# Altium integrated library Connector-SIL-THP.IntLib: 464 symbols (part 1 of 2) (continued)
## DG333J-3.5-03P-13-00A(H) (continued)
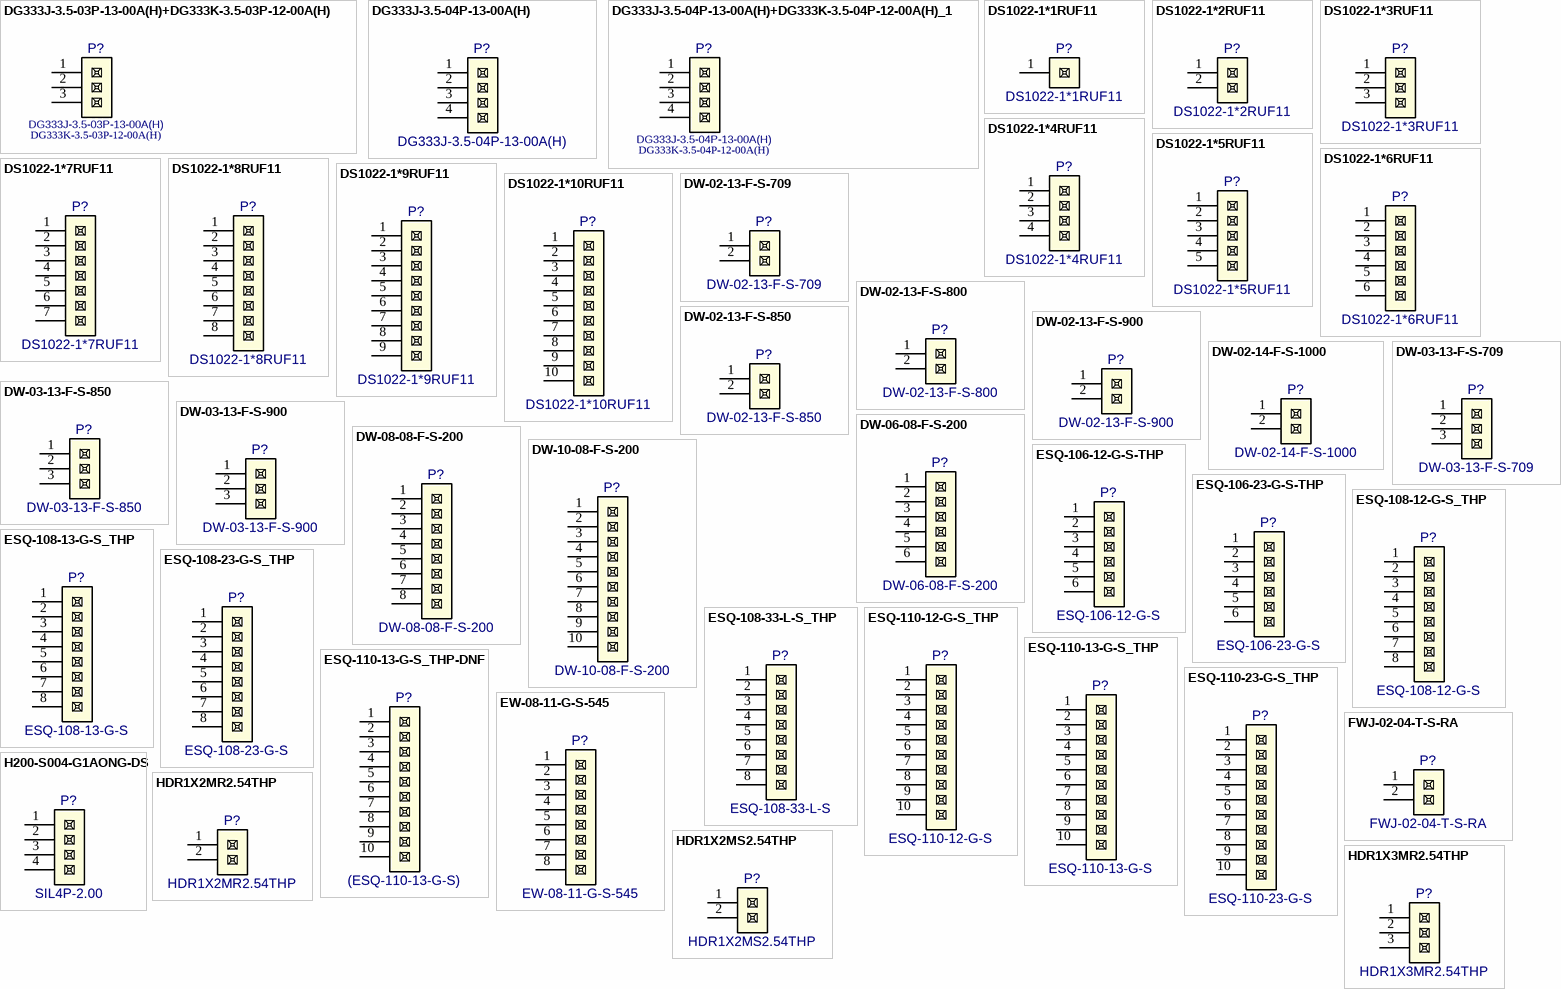
[diagram p3: symbols DG333J-3.5-03P-13-00A(H)+DG333K-3.5-03P-12-00A(H) to HDR1X3MR2.54THP]

## DG333J-3.5-03P-13-00A(H)+DG333K-3.5-03P-12-00A(H)
designator P?  Text2: DG333K-3.5-03P-12-00A(H)  Text1: DG333J-3.5-03P-13-00A(H)  (hidden comment: DG333J-3.5-03P-13-00A(H)+DG333K-3.5-03P-12-00A(H))
PIN Strip and Terminal block 3.5mm Pitch; Manufacturer: Degson; Value: DG333J-3.5-03P-13-00A(H)/DG333K-3.5-03P-12-00A(H); Package: DG333J-3.5-03P-13-00A(H)/DG333K-3.5-03P-12-00A(H); EDM-PN: *; Part Number: DG333J-3.5-03P-13-00A(H)+DG333K-3.5-03P-12-00A(H); SAAB PN: *
footprint DG333J-3.5-03P-13-00A(H)/DG333K-3.5-03P-12-00A(H) (Pin Strip, 3.5mm Pitch)
pins: 1, 2, 3

## DG333J-3.5-04P-13-00A(H)
designator P?
Pin Strip, 3.5mm Pitch; Manufacturer: Degson; Package: DG333J-3.5-04P-13-00A(H); EDM-PN: *; Text2: *; Text1: *; Value: DG333J-3.5-04P-13-00A(H); Part Number: DG333J-3.5-04P-13-00A(H); SAAB PN: *
footprint DG333J-3.5-04P-13-00A(H) (Pin Strip, 3.5mm Pitch)
pins: 1, 2, 3, 4

## DG333J-3.5-04P-13-00A(H)+DG333K-3.5-04P-12-00A(H)_1
designator P?, comment Text2: DG333K-3.5-04P-12-00A(H)  Text1: DG333J-3.5-04P-13-00A(H)  (hidden comment: DG333J-3.5-04P-13-00A(H)+DG333K-3.5-04P-12-00A(H))
PIN Strip and Terminal block 3.5mm Pitch; Manufacturer: Degson; Value: DG333J-3.5-04P-13-00A(H)/DG333K-3.5-04P-12-00A(H); Package: DG333J-3.5-04P-13-00A(H)/DG333K-3.5-04P-12-00A(H); EDM-PN: *; Part Number: DG333J-3.5-04P-13-00A(H)+DG333K-3.5-04P-12-00A(H); SAAB PN: *
footprint DG333J-3.5-04P-13-00A(H)/DG333K-3.5-04P-12-00A(H) (Pin Strip, 3.5mm Pitch)
pins: 1, 2, 3, 4

## DS1022-1*1RUF11
designator P?
Header SIL Male 2.54mm Rt Angle Type-U; Manufacturer: Connfly; Package: SIL1PR-2.54-U; EDM-PN: *; Text2: *; Text1: *; Part Number: DS1022-1*1RUF11; Value: DS1022-1*1RUF11; SAAB PN: *
footprint SIL1PR-2.54-U (SIL Male Rt Angle THP Header, 2.54mm Pitch Type-U)
pins: 1

## DS1022-1*2RUF11
designator P?
Header SIL Male 2.54mm Rt Angle Type-U; Manufacturer: Connfly; Package: SIL2PR-2.54-U; EDM-PN: *; Text2: *; Text1: *; Part Number: DS1022-1*2RUF11; Value: DS1022-1*2RUF11; SAAB PN: *
footprint SIL2PR-2.54-U (SIL Male Rt Angle THP Header, 2.54mm Pitch Type-U)
pins: 1, 2

## DS1022-1*3RUF11
designator P?
Header SIL Male 2.54mm Rt Angle Type-U; Manufacturer: Connfly; Package: SIL3PR-2.54-U; EDM-PN: *; Text2: *; Text1: *; Part Number: DS1022-1*3RUF11; Value: DS1022-1*3RUF11; SAAB PN: *
footprint SIL3PR-2.54-U (SIL Male Rt Angle THP Header, 2.54mm Pitch Type-U)
pins: 1, 2, 3

## DS1022-1*4RUF11
designator P?
Header SIL Male 2.54mm Rt Angle Type-U; Manufacturer: Connfly; Package: SIL4PR-2.54-U; EDM-PN: *; Text2: *; Text1: *; Part Number: DS1022-1*4RUF11; Value: DS1022-1*4RUF11; SAAB PN: *
footprint SIL4PR-2.54-U (SIL Male Rt Angle THP Header, 2.54mm Pitch Type-U)
pins: 1, 2, 3, 4

## DS1022-1*5RUF11
designator P?
Header SIL Male 2.54mm Rt Angle Type-U; Manufacturer: Connfly; Package: SIL5PR-2.54-U; EDM-PN: *; Text2: *; Text1: *; Part Number: DS1022-1*5RUF11; Value: DS1022-1*5RUF11; SAAB PN: *
footprint SIL5PR-2.54-U (SIL Male Rt Angle THP Header, 2.54mm Pitch Type-U)
pins: 1, 2, 3, 4, 5

## DS1022-1*6RUF11
designator P?
Header SIL Male 2.54mm Rt Angle Type-U; Manufacturer: Connfly; Package: SIL6PR-2.54-U; EDM-PN: *; Text2: *; Text1: *; Part Number: DS1022-1*6RUF11; Value: DS1022-1*6RUF11; SAAB PN: *
footprint SIL6PR-2.54-U (SIL Male Rt Angle THP Header, 2.54mm Pitch Type-U)
pins: 1, 2, 3, 4, 5, 6

## DS1022-1*7RUF11
designator P?
Header SIL Male 2.54mm Rt Angle Type-U; Manufacturer: Connfly; Package: SIL7PR-2.54-U; EDM-PN: *; Text2: *; Text1: *; Part Number: DS1022-1*7RUF11; Value: DS1022-1*7RUF11; SAAB PN: *
footprint SIL7PR-2.54-U (SIL Male Rt Angle THP Header, 2.54mm Pitch Type-U)
pins: 1, 2, 3, 4, 5, 6, 7

## DS1022-1*8RUF11
designator P?
Header SIL Male 2.54mm Rt Angle Type-U; Manufacturer: Connfly; Package: SIL8PR-2.54-U; EDM-PN: *; Text2: *; Text1: *; Part Number: DS1022-1*8RUF11; Value: DS1022-1*8RUF11; SAAB PN: *
footprint SIL8PR-2.54-U (SIL Male Rt Angle THP Header, 2.54mm Pitch Type-U)
pins: 1, 2, 3, 4, 5, 6, 7, 8

## DS1022-1*9RUF11
designator P?
Header SIL Male 2.54mm Rt Angle Type-U; Manufacturer: Connfly; Package: SIL9PR-2.54-U; EDM-PN: *; Text2: *; Text1: *; Part Number: DS1022-1*9RUF11; Value: DS1022-1*9RUF11; SAAB PN: *
footprint SIL9PR-2.54-U (SIL Male Rt Angle THP Header, 2.54mm Pitch Type-U)
pins: 1, 2, 3, 4, 5, 6, 7, 8, 9

## DS1022-1*10RUF11
designator P?
Header SIL Male 2.54mm Rt Angle Type-U; Manufacturer: Connfly; Package: SIL10PR-2.54-U; EDM-PN: *; Text2: *; Text1: *; Part Number: DS1022-1*10RUF11; Value: DS1022-1*10RUF11; SAAB PN: *
footprint SIL10PR-2.54-U (SIL Male Rt Angle THP Header, 2.54mm Pitch Type-U)
pins: 1, 2, 3, 4, 5, 6, 7, 8, 9, 10

## DW-02-13-F-S-709
designator P?
Header SIL Male THP, 2.54mm Pitch; Manufacturer: Samtec; Package: DW-02-13-F-S-709; EDM-PN: *; Text2: *; Text1: *; Value: DW-02-13-F-S-709; SAAB PN: *; Part Number: DW-02-13-F-S-709
footprint DW-02-13-F-S-709 (SIL Strip 2.54mm)
pins: 1, 2

## DW-02-13-F-S-800
designator P?
Header SIL Male THP, 2.54mm Pitch; Manufacturer: Samtec; Package: DW-02-13-F-S-800; EDM-PN: *; Text2: *; Text1: *; Value: DW-02-13-F-S-800; SAAB PN: *; Part Number: DW-02-13-F-S-800
footprint DW-02-13-F-S-800 (SIL Strip 2.54mm)
pins: 1, 2

## DW-02-13-F-S-850
designator P?
Header SIL Male THP, 2.54mm Pitch; Manufacturer: Samtec; Package: DW-02-13-F-S-850; EDM-PN: *; Text2: *; Text1: *; Value: DW-02-13-F-S-850; SAAB PN: *; Part Number: DW-02-13-F-S-850
footprint DW-02-13-F-S-850 (SIL Strip 2.54mm)
pins: 1, 2

## DW-02-13-F-S-900
designator P?
Header SIL Male THP, 2.54mm Pitch; Manufacturer: Samtec; Package: DW-02-13-F-S-900; EDM-PN: *; Text2: *; Text1: *; Value: DW-02-13-F-S-900; SAAB PN: *; Part Number: DW-02-13-F-S-900
footprint DW-02-13-F-S-900 (SIL Strip 2.54mm)
pins: 1, 2

## DW-02-14-F-S-1000
designator P?
Header SIL Male THP, 2.54mm Pitch; Manufacturer: Samtec; Package: DW-02-14-F-S-1000; EDM-PN: *; Text2: *; Text1: *; Value: DW-02-14-F-S-1000; Part Number: DW-02-14-F-S-1000; SAAB PN: *
footprint DW-02-14-F-S-1000 (SIL Strip 2.54mm)
pins: 1, 2

## DW-03-13-F-S-709
designator P?
Header SIL Male THP, 2.54mm Pitch; Manufacturer: Samtec; Package: DW-03-13-F-S-709; EDM-PN: *; Text2: *; Text1: *; Value: DW-03-13-F-S-709; SAAB PN: *; Part Number: DW-03-13-F-S-709
footprint DW-03-13-F-S-709 (SIL Strip 2.54mm)
pins: 1, 2, 3

## DW-03-13-F-S-850
designator P?
Header SIL Male THP, 2.54mm Pitch; Manufacturer: Samtec; Package: DW-03-13-F-S-850; EDM-PN: *; Text2: *; Text1: *; Value: DW-03-13-F-S-850; SAAB PN: *; Part Number: DW-03-13-F-S-850
footprint DW-03-13-F-S-850 (SIL Strip 2.54mm)
pins: 1, 2, 3

## DW-03-13-F-S-900
designator P?
Header SIL Male THP, 2.54mm Pitch; Manufacturer: Samtec; Package: DW-03-13-F-S-900; EDM-PN: *; Text2: *; Text1: *; Value: DW-03-13-F-S-900; SAAB PN: *; Part Number: DW-03-13-F-S-900
footprint DW-03-13-F-S-900 (SIL Strip 2.54mm)
pins: 1, 2, 3

## DW-06-08-F-S-200
designator P?
Header SIL Male THP, 2.54mm Pitch; Manufacturer: Samtec; Package: DW-06-08-F-S-200; EDM-PN: *; Text2: *; Text1: *; Value: DW-06-08-F-S-200; SAAB PN: *; Part Number: DW-06-08-F-S-200
footprint DW-06-08-F-S-200 (DW06-08-F-S-200 2.54mm)
pins: 1, 2, 3, 4, 5, 6

## DW-08-08-F-S-200
designator P?
Header SIL Male THP, 2.54mm Pitch; Manufacturer: Samtec; Package: DW-08-08-F-S-200; EDM-PN: *; Text2: *; Text1: *; Value: DW-08-08-F-S-200; SAAB PN: *; Part Number: DW-08-08-F-S-200
footprint DW-08-08-F-S-200 (SIL Strip 2.54mm)
pins: 1, 2, 3, 4, 5, 6, 7, 8

## DW-10-08-F-S-200
designator P?
Header SIL Male THP, 2.54mm Pitch; Manufacturer: Samtec; Package: DW-10-08-F-S-200; EDM-PN: *; Text2: *; Text1: *; Value: DW-10-08-F-S-200; SAAB PN: *; Part Number: DW-10-08-F-S-200
footprint DW-10-08-F-S-200 (SIL Strip 2.54mm)
pins: 1, 2, 3, 4, 5, 6, 7, 8, 9, 10

## ESQ-106-12-G-S-THP
designator P?, comment ESQ-106-12-G-S
Header SIL Female THP, 2.54mm Pitch; Manufacturer: Samtec; Package: ESQ-106-12-G-S; EDM-PN: *; Text2: *; Text1: *; Value: ESQ-106-12-G-S; SAAB PN: *; Part Number: ESQ-106-12-G-S
footprint ESQ-106-12-G-S (ESQ-106-12-G-S 2.54mm)
pins: 1, 2, 3, 4, 5, 6

## ESQ-106-23-G-S-THP
designator P?, comment ESQ-106-23-G-S
Header SIL Female THP, 2.54mm Pitch; Manufacturer: Samtec; Package: ESQ-106-23-G-S; EDM-PN: *; Text2: *; Text1: *; Value: ESQ-106-23-G-S; SAAB PN: *; Part Number: ESQ-106-23-G-S
footprint ESQ-106-23-G-S (ESQ-106-23-G-S 2.54mm)
pins: 1, 2, 3, 4, 5, 6

## ESQ-108-12-G-S_THP
designator P?, comment ESQ-108-12-G-S
Socket Elevated THP,  2.54mm Pitch; Manufacturer: Samtec; Value: ESQ-108-12-G-S_THP; Package: ESQ-108-12-G-S; EDM-PN: *; Text2: *; Text1: *; SAAB PN: *; Part Number: ESQ-108-12-G-S
footprint ESQ-108-12-D-S (ESQ-108-12-D-S - Socket)
pins: 1, 2, 3, 4, 5, 6, 7, 8

## ESQ-108-13-G-S_THP
designator P?, comment ESQ-108-13-G-S
Socket Elevated THP,  2.54mm Pitch; Manufacturer: Samtec; Value: ESQ-108-13-G-S_THP; Package: ESQ-108-13-G-S; EDM-PN: *; Text2: *; Text1: *; SAAB PN: *; Part Number: ESQ-108-13-G-S
footprint ESQ-108-13-D-S
pins: 1, 2, 3, 4, 5, 6, 7, 8

## ESQ-108-23-G-S_THP
designator P?, comment ESQ-108-23-G-S
Socket Elevated THP,  2.54mm Pitch; Manufacturer: Samtec; Package: ESQ-108-23-G-S; EDM-PN: *; Text2: *; Text1: *; Value: ESQ-108-23-G-S; SAAB PN: *; Part Number: ESQ-108-23-G-S
footprint ESQ-108-23-D-S
pins: 1, 2, 3, 4, 5, 6, 7, 8

## ESQ-108-33-L-S_THP
designator P?, comment ESQ-108-33-L-S
Socket Elevated THP,  2.54mm Pitch; Manufacturer: Samtec; Package: ESQ-108-33-X-S; EDM-PN: *; Text2: *; Text1: *; Value: ESQ-108-33-L-S; SAAB PN: *; Part Number: ESQ-108-33-L-S
footprint ESQ-108-33-X-S (ESQ-108-33-X-S- Socket)
pins: 1, 2, 3, 4, 5, 6, 7, 8

## ESQ-110-12-G-S_THP
designator P?, comment ESQ-110-12-G-S
Socket Elevated THP,  2.54mm Pitch; Manufacturer: Samtec; Value: ESQ-110-12-G-S_THP; Package: ESQ-110-12-G-S; EDM-PN: *; Text2: *; Text1: *; SAAB PN: *; Part Number: ESQ-110-12-G-S
footprint ESQ-110-12-D-S (ESQ-110-12-D-S - Socket)
pins: 1, 2, 3, 4, 5, 6, 7, 8, 9, 10

## ESQ-110-13-G-S_THP
designator P?, comment ESQ-110-13-G-S
Socket Elevated THP,  2.54mm Pitch; Manufacturer: Samtec; Value: ESQ-110-13-G-S_THP; Package: ESQ-110-13-G-S; EDM-PN: *; Text2: *; Text1: *; SAAB PN: *; Part Number: ESQ-110-13-G-S
footprint ESQ-110-13-D-S (ESQ-110-13-D-S - Socket)
pins: 1, 2, 3, 4, 5, 6, 7, 8, 9, 10

## ESQ-110-13-G-S_THP-DNF
designator P?, comment value (ESQ-110-13-G-S)  (hidden comment: ESQ-110-13-G-S-DNF)
Socket Elevated THP,  2.54mm Pitch - Do not Fit; Manufacturer: Samtec; Part Number: DNF - ESQ-110-13-G-S; Package: ESQ-110-13-G-S; EDM-PN: *; Text2: *; Text1: *; SAAB PN: *
footprint ESQ-110-13-D-S (ESQ-110-13-D-S - Socket)
pins: 1, 2, 3, 4, 5, 6, 7, 8, 9, 10

## ESQ-110-23-G-S_THP
designator P?, comment ESQ-110-23-G-S
Socket Elevated THP,  2.54mm Pitch; Manufacturer: Samtec; Package: ESQ-110-23-G-S; EDM-PN: *; Text2: *; Text1: *; Value: ESQ-110-23-G-S; SAAB PN: *; Part Number: ESQ-110-23-G-S
footprint ESQ-110-23-D-S (ESQ-110-23-D-S - Socket)
pins: 1, 2, 3, 4, 5, 6, 7, 8, 9, 10

## EW-08-11-G-S-545
designator P?
Header SIL Male THP, 2.54mm Pitch Extended; Manufacturer: Samtec; Package: EW-08-11-G-S-545; EDM-PN: *; Text2: *; Text1: *; Value: EW-08-11-G-S-545; Part Number: EW-08-11-G-S-545; SAAB PN: *
footprint EW-08-11-G-S-545 (SIL Strip 2.54mm)
pins: 1, 2, 3, 4, 5, 6, 7, 8

## FWJ-02-04-T-S-RA
designator P?
Header SIL Male Rt Angle THP, 3.96mm Pitch; Manufacturer: Samtec; Package: FWJ-02-04-T-S-RA; EDM-PN: *; Text2: *; Text1: *; Value: FWJ-02-04-T-S-RA; Part Number: FWJ-02-04-T-S-RA; SAAB PN: *
footprint FWJ-02-04-T-S-RA
pins: 1, 2

## H200-S004-G1AONG-DS
designator P?  value SIL4P-2.00  (hidden comment: H200-S004-G1AONG-DS)
Header SIL Male THP, 2.00mm Pitch; Manufacturer: Speccon; Package: SIL4P-2.00; EDM-PN: *; Text2: *; Text1: *; Part Number: H200-S004-G1AONG-DS; SAAB PN: *
footprint SIL4P-2.00 (SIL4P 8.0x2.0mm)
pins: 1, 2, 3, 4

## HDR1X2MR2.54THP
designator P?
SIL Male Rt Angle THP Header, 2.54mm Pitch; Manufacturer: Various; Package: HDR1X2MR2.54THP; EDM-PN: *; Text2: *; Text1: *; Value: HDR1X2MR2.54THP; SAAB PN: *; Part Number: HDR1X2MR2.54THP
footprint HDR1X2MR2.54THP (SIL Male Rt Angle THP Header, 2.54mm Pitch)
pins: 1, 2

## HDR1X2MS2.54THP
designator P?
SIL Male Straight THP Header, 2.54mm Pitch; Manufacturer: Various; EDM-PN: CON12; Package: HDR1X2MS2.54THP; Text2: *; Text1: *; Value: HDR1X2MS2.54THP; SAAB PN: *; Part Number: HDR1X2MS2.54THP
footprint HDR1X2MS2.54THP (SIL Male Straight THP Header, 2.54mm Pitch)
pins: 1, 2

## HDR1X3MR2.54THP
designator P?
SIL Male Rt Angle THP Header, 2.54mm Pitch; Manufacturer: Various; Package: HDR1X3MR2.54THP; EDM-PN: *; Text2: *; Text1: *; Value: HDR1X3MR2.54THP; SAAB PN: *; Part Number: HDR1X3MR2.54THP
footprint HDR1X3MR2.54THP (SIL Male Rt Angle THP Header, 2.54mm Pitch)
pins: 1, 2, 3

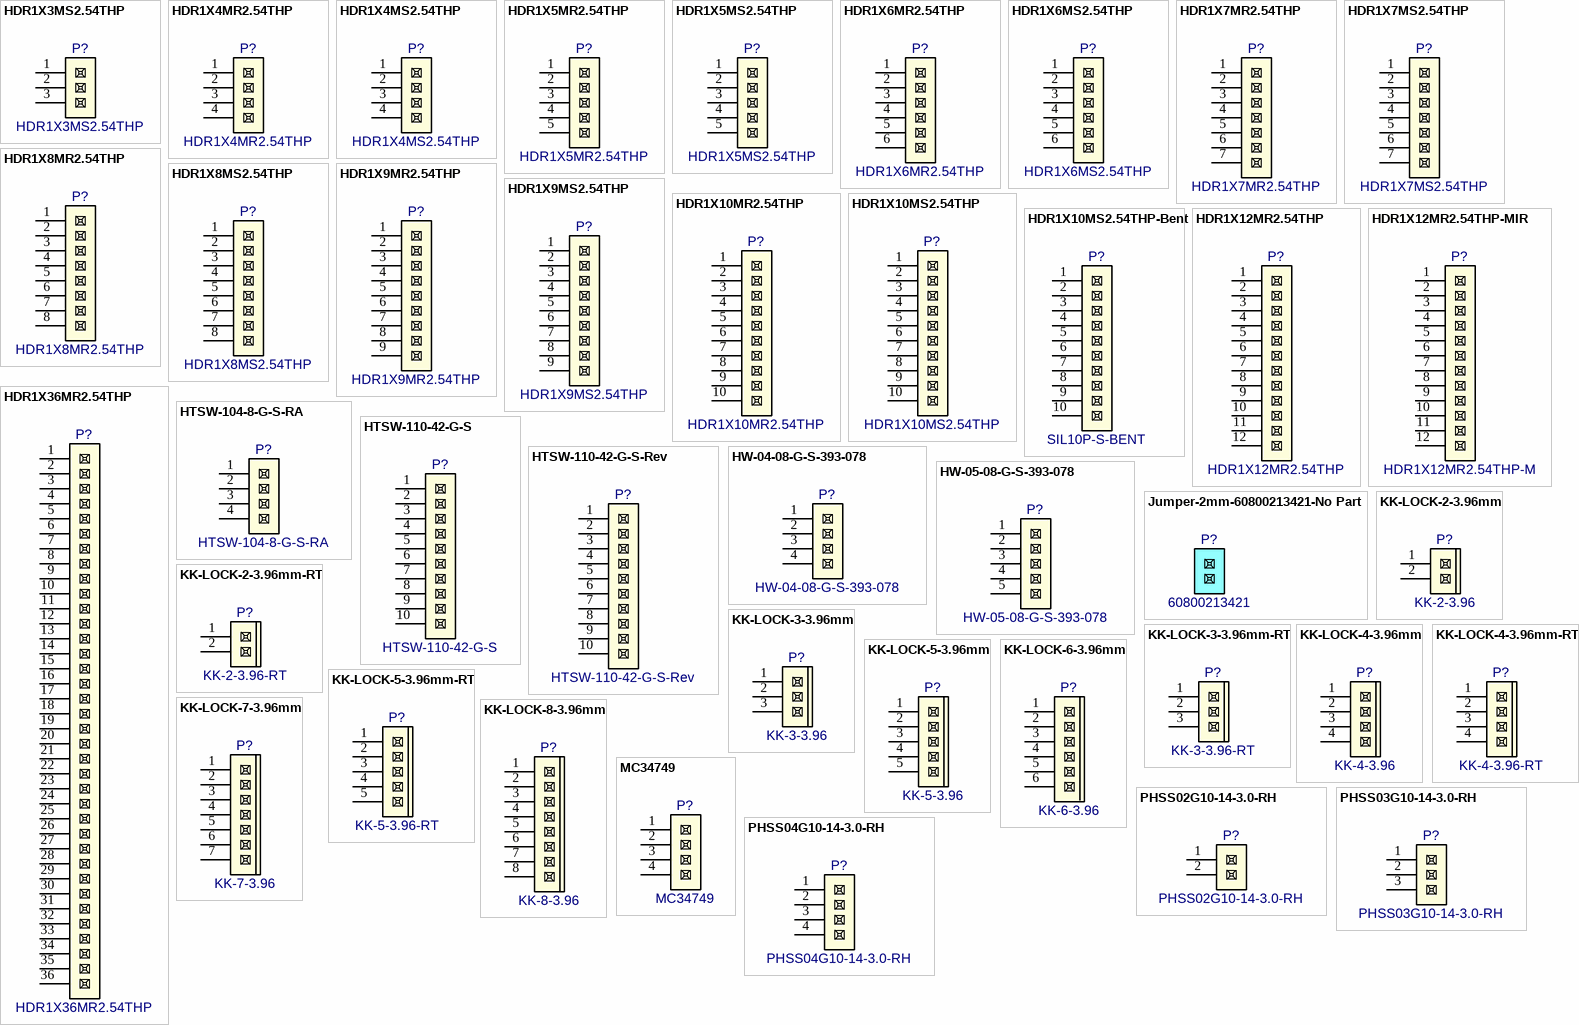
[diagram p4: symbols HDR1X3MS2.54THP to PHSS04G10-14-3.0-RH]

## HDR1X3MS2.54THP
designator P?
SIL Male Straight THP Header, 2.54mm Pitch; Manufacturer: Various; EDM-PN: CON12; Package: HDR1X3MS2.54THP; Text2: *; Text1: *; Value: HDR1X3MS2.54THP; SAAB PN: *; Part Number: HDR1X3MS2.54THP
footprint HDR1X3MS2.54THP (SIL Male Straight THP Header, 2.54mm Pitch)
pins: 1, 2, 3

## HDR1X4MR2.54THP
designator P?
SIL Male Rt Angle THP Header, 2.54mm Pitch; Manufacturer: Various; Package: HDR1X4MR2.54THP; EDM-PN: *; Text2: *; Text1: *; Value: HDR1X4MR2.54THP; SAAB PN: *; Part Number: HDR1X4MR2.54THP
footprint HDR1X4MR2.54THP (SIL Male Rt Angle THP Header, 2.54mm Pitch)
pins: 1, 2, 3, 4

## HDR1X4MS2.54THP
designator P?
SIL Male Straight THP Header, 2.54mm Pitch; Manufacturer: Various; EDM-PN: CON12; Package: HDR1X4MS2.54THP; Text2: *; Text1: *; Value: HDR1X4MS2.54THP; SAAB PN: *; Part Number: HDR1X4MS2.54THP
footprint HDR1X4MS2.54THP (SIL 4 Way Male Straight THP Header, 2.54mm Pitch)
pins: 1, 2, 3, 4

## HDR1X5MR2.54THP
designator P?
SIL Male Rt Angle THP Header, 2.54mm Pitch; Manufacturer: Various; Package: HDR1X5MR2.54THP; EDM-PN: *; Text2: *; Text1: *; Value: HDR1X5MR2.54THP; Part Number: HDR1X5MR2.54THP; SAAB PN: *
footprint HDR1X5MR2.54THP (SIL Male Rt Angle THP Header, 2.54mm Pitch)
pins: 1, 2, 3, 4, 5

## HDR1X5MS2.54THP
designator P?
SIL Male Straight THP Header, 2.54mm Pitch; Manufacturer: Various; EDM-PN: CON12; Package: HDR1X5MS2.54THP; Text2: *; Text1: *; Value: HDR1X5MS2.54THP; SAAB PN: *; Part Number: HDR1X5MS2.54THP
footprint HDR1X5MS2.54THP (SIL 5 Way Male Straight THP Header, 2.54mm Pitch)
pins: 1, 2, 3, 4, 5

## HDR1X6MR2.54THP
designator P?
SIL Male Rt Angle THP Header, 2.54mm Pitch; Manufacturer: Various; Package: HDR1X6MR2.54THP; EDM-PN: *; Text2: *; Text1: *; Value: HDR1X6MR2.54THP; Part Number: HDR1X6MR2.54THP; SAAB PN: *
footprint HDR1X6MR2.54THP (SIL Male Rt Angle THP Header, 2.54mm Pitch)
pins: 1, 2, 3, 4, 5, 6

## HDR1X6MS2.54THP
designator P?
SIL Male Straight THP Header, 2.54mm Pitch; Manufacturer: Various; EDM-PN: CON12; Package: HDR1X6MS2.54THP; Text2: *; Text1: *; Value: HDR1X6MS2.54THP; SAAB PN: *; Part Number: HDR1X6MS2.54THP
footprint HDR1X6MS2.54THP (SIL 6 Way Male Straight THP Header, 2.54mm Pitch)
pins: 1, 2, 3, 4, 5, 6

## HDR1X7MR2.54THP
designator P?
SIL Male Rt Angle THP Header, 2.54mm Pitch; Manufacturer: Various; Package: HDR1X7MR2.54THP; EDM-PN: *; Text2: *; Text1: *; Value: HDR1X7MR2.54THP; SAAB PN: *; Part Number: HDR1X7MR2.54THP
footprint HDR1X7MR2.54THP (SIL Male Rt Angle THP Header, 2.54mm Pitch)
pins: 1, 2, 3, 4, 5, 6, 7

## HDR1X7MS2.54THP
designator P?
SIL Male Straight THP Header, 2.54mm Pitch; Manufacturer: Various; EDM-PN: CON12; Package: HDR1X7MS2.54THP; Text2: *; Text1: *; Value: HDR1X7MS2.54THP; SAAB PN: *; Part Number: HDR1X7MS2.54THP
footprint HDR1X7MS2.54THP (SIL 7 Way Male Straight THP Header, 2.54mm Pitch)
pins: 1, 2, 3, 4, 5, 6, 7

## HDR1X8MR2.54THP
designator P?
SIL Male Rt Angle THP Header, 2.54mm Pitch; Manufacturer: Various; Package: HDR1X8MR2.54THP; EDM-PN: *; Text2: *; Text1: *; Value: HDR1X8MR2.54THP; Part Number: HDR1X8MR2.54THP; SAAB PN: *
footprint HDR1X8MR2.54THP (SIL Male Rt Angle THP Header, 2.54mm Pitch)
pins: 1, 2, 3, 4, 5, 6, 7, 8

## HDR1X8MS2.54THP
designator P?
SIL Male Straight THP Header, 2.54mm Pitch; Manufacturer: Various; EDM-PN: CON12; Package: HDR1X8MS2.54THP; Text2: *; Text1: *; Value: HDR1X8MS2.54THP; SAAB PN: *; Part Number: HDR1X8MS2.54THP
footprint HDR1X8MS2.54THP (SIL 8 Way Male Straight THP Header, 2.54mm Pitch)
pins: 1, 2, 3, 4, 5, 6, 7, 8

## HDR1X9MR2.54THP
designator P?
SIL Male Rt Angle THP Header, 2.54mm Pitch; Manufacturer: Various; Package: HDR1X9MR2.54THP; EDM-PN: *; Text2: *; Text1: *; Value: HDR1X9MR2.54THP; SAAB PN: *; Part Number: HDR1X9MR2.54THP
footprint HDR1X9MR2.54THP (SIL Male Rt Angle THP Header, 2.54mm Pitch)
pins: 1, 2, 3, 4, 5, 6, 7, 8, 9

## HDR1X9MS2.54THP
designator P?
SIL Male Straight THP Header, 2.54mm Pitch; Manufacturer: Various; EDM-PN: CON12; Package: HDR1X9MS2.54THP; Text2: *; Text1: *; Value: HDR1X9MS2.54THP; SAAB PN: *; Part Number: HDR1X9MS2.54THP
footprint HDR1X9MS2.54THP (SIL 9 Way Male Straight THP Header, 2.54mm Pitch)
pins: 1, 2, 3, 4, 5, 6, 7, 8, 9

## HDR1X10MR2.54THP
designator P?
SIL Male Rt Angle THP Header, 2.54mm Pitch; Manufacturer: Various; Package: HDR1X10MR2.54THP; EDM-PN: *; Text2: *; Text1: *; Value: HDR1X10MR2.54THP; SAAB PN: *; Part Number: HDR1X10MR2.54THP
footprint HDR1X10MR2.54THP (SIL Male Rt Angle THP Header, 2.54mm Pitch)
pins: 1, 2, 3, 4, 5, 6, 7, 8, 9, 10

## HDR1X10MS2.54THP
designator P?
SIL Male Straight THP Header, 2.54mm Pitch; Manufacturer: Various; EDM-PN: CON12; Package: HDR1X10MS2.54THP; Text2: *; Text1: *; Value: HDR1X10MS2.54THP; SAAB PN: *; Part Number: HDR1X10MS2.54THP
footprint HDR1X10MS2.54THP (SIL 10 Way Male Straight THP Header, 2.54mm Pitch)
pins: 1, 2, 3, 4, 5, 6, 7, 8, 9, 10

## HDR1X10MS2.54THP-Bent
designator P?  value SIL10P-S-BENT  (hidden comment: HDR1X10MS2.54THP-Bent)
SIL Male Straight Bent Pins THP Header, 2.54mm Pitch; Manufacturer: Molex; Part Number: 0022052101; Package: HDR1X10MS2.54THP-BENT; EDM-PN: *; Text2: *; Text1: *; SAAB PN: *
footprint HDR1X10MS2.54THP-BENT (SIL 10 Way Male Straight bent Pins THP Header, 2.54mm Pitch)
pins: 1, 2, 3, 4, 5, 6, 7, 8, 9, 10

## HDR1X12MR2.54THP
designator P?
Header Male Rt Angle THP Header, 2.54mm Pitch; Manufacturer: Various; Package: HDR1X12MR2.54THP; EDM-PN: *; Text2: *; Text1: *; Value: HDR1X12MR2.54THP; Part Number: HDR1X12MR2.54THP; SAAB PN: *
footprint HDR1X12MR2.54THP (SIL Male Rt Angle THP Header, 2.54mm Pitch)
pins: 1, 2, 3, 4, 5, 6, 7, 8, 9, 10, 11, 12

## HDR1X12MR2.54THP-MIR
designator P?  Part Number: HDR1X12MR2.54THP-M  (hidden comment: HDR1X12MR2.54THP-MIR)
Header Male Rt Angle THP, 2.54mm Pitch; Manufacturer: Various; Package: HDR1X12MR2.54THP-M; EDM-PN: *; Text2: *; Text1: *; Value: HDR1X12MR2.54THP-M; SAAB PN: *
footprint HDR1X12MR2.54THP-M (SIL Male Rt Angle THP Header, 2.54mm Pitch (Mirrored))
pins: 1, 2, 3, 4, 5, 6, 7, 8, 9, 10, 11, 12

## HDR1X36MR2.54THP
designator P?
SIL Male Rt Angle THP Header, 2.54mm Pitch; Manufacturer: Various; Package: HDR1X36MR2.54THP; EDM-PN: *; Text2: *; Text1: *; Value: HDR1X36MR2.54THP; Part Number: HDR1X36MR2.54THP; SAAB PN: *
footprint HDR1X36MR2.54THP (SIL Male Rt Angle THP Header, 2.54mm Pitch)
pins: 1, 2, 3, 4, 5, 6, 7, 8, 9, 10, 11, 12, 13, 14, 15, 16, 17, 18, 19, 20, 21, 22, 23, 24, 25, 26, 27, 28, 29, 30, 31, 32, 33, 34, 35, 36